# Altium footprint library micromouse_Lib.PcbLib: 7 footprints
Each footprint in its own frame and in the unit in brackets; x right, y up, seen from the top. Pads: shape width x height; smd on the part's side, far side on the other; paste and mask are expansions set on the pad; w line width, h text height; cw(c..) or ccw(c..) is an arc to the next point about the centre after c.
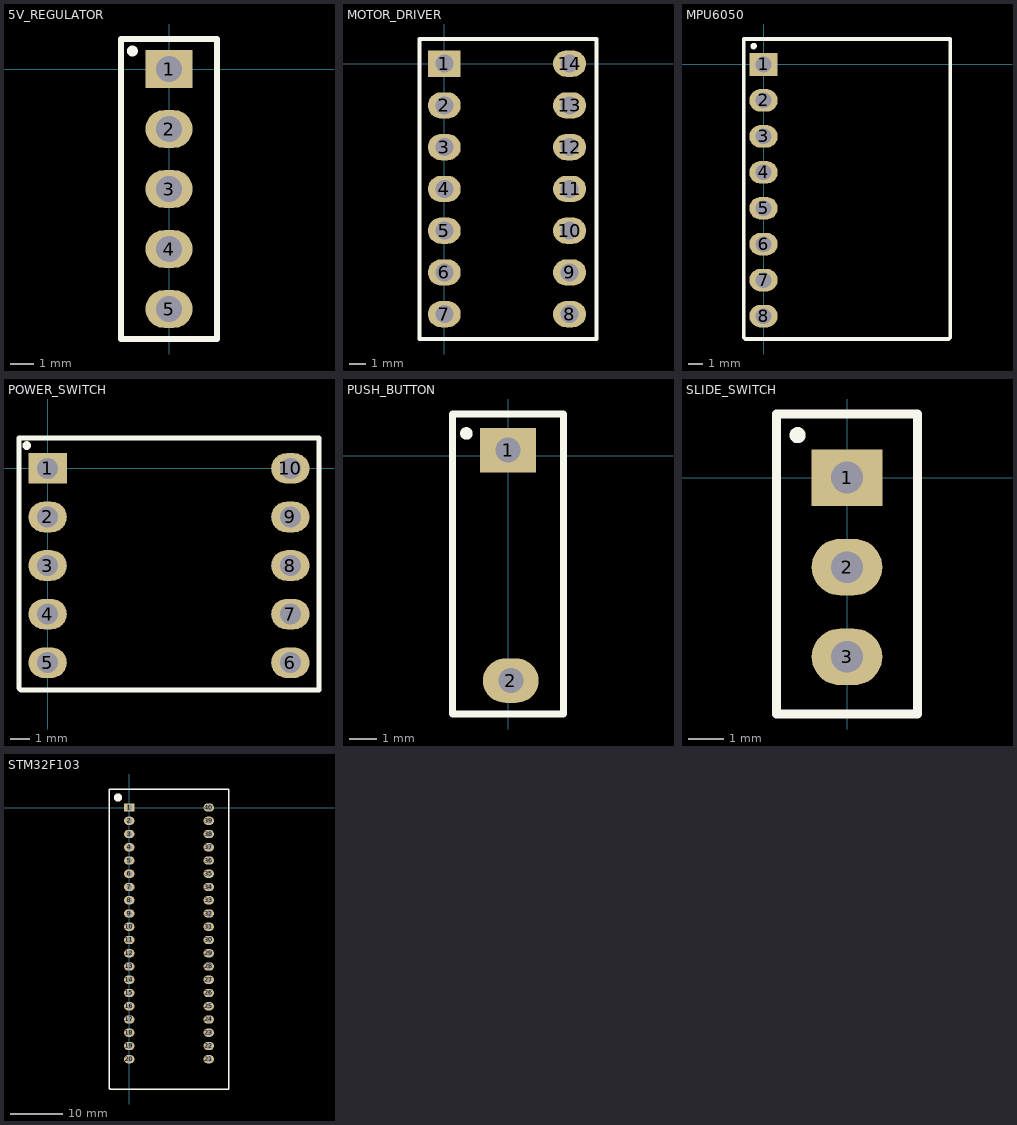
[diagram p0: the footprints below, top view; thin cyan lines are the x and y axes]

## 5V_REGULATOR [mm]
pads (5):
  rect 2x1.6 hole 1.1: 1(0,0)
  oval 2x1.6 hole 1.1: 2(0,-2.54) 3(0,-5.08) 4(0,-7.62) 5(0,-10.16)
Top Overlay:
  circle w0.254: c-1.549,0.762 r0.102
  lines w0.254: -2.032,-11.43 2.032,-11.43 2.032,1.27 -2.032,1.27 -2.032,-11.43
3D body "Step Down Buck.STEP": height 17.78, standoff 0, extent -2.038,-11.43 1.778,1.27

## MOTOR_DRIVER [mm]
pads (14):
  rect 2x1.6 hole 1.1: 1(0,0)
  oval 2x1.6 hole 1.1: 2(0,-2.54) 3(0,-5.08) 4(0,-7.62) 5(0,-10.16) 6(0,-12.7) 7(0,-15.24) 8(7.62,-15.24) 9(7.62,-12.7) 10(7.62,-10.16) 11(7.62,-7.62) 12(7.62,-5.08) 13(7.62,-2.54) 14(7.62,0)
Top Overlay:
  lines w0.254: -1.5,-16.75 9.25,-16.75 9.25,1.5 -1.5,1.5 -1.5,-16.75
3D body "Dual motor driver.STEP": height 11.82, standoff 9, extent -1.26,-16.49 8.9,1.29
3D body "User Library-zl262-7s_p2-54_l18-28_w2-54_h8-5.STEP": height 8.5, standoff -3, extent -1.24,-16.74 1.3,1.54
3D body "User Library-zl262-7s_p2-54_l18-28_w2-54_h8-5.STEP": height 8.5, standoff -3, extent 6.36,-16.74 8.9,1.54

## MPU6050 [mm]
pads (8):
  rect 2x1.6 hole 1.1: 1(0,0)
  oval 2x1.6 hole 1.1: 2(0,-2.54) 3(0,-5.08) 4(0,-7.62) 5(0,-10.16) 6(0,-12.7) 7(0,-15.24) 8(0,-17.78)
Top Overlay:
  circle w0.254: c-0.7,1.3 r0.1
  lines w0.254: -1.4,-19.3 -1.3,-19.4 13.1,-19.4 13.2,-19.3 13.2,0.5 13.2,1.8 -1.4,1.8 -1.4,-19.3
3D body "MPU 6050.STEP": height 8.94, standoff -2.23, extent -1.371,-19.368 14.503,1.74

## POWER_SWITCH [mm]
pads (10):
  rect 2x1.6 hole 1.1: 1(0,0)
  oval 2x1.6 hole 1.1: 2(0,-2.54) 3(0,-5.08) 4(0,-7.62) 5(0,-10.16) 6(12.7,-10.16) 7(12.7,-7.62) 8(12.7,-5.08) 9(12.7,-2.54) 10(12.7,0)
Top Overlay:
  circle w0.254: c-1.1,1.2 r0.1
  lines w0.254: -1.5,-11.5 -1.4,-11.6 14.2,-11.6 14.2,1.6 -1.5,1.6 -1.5,-11.5
3D body "Female Header 5 pin.STEP": height 8.5, standoff -3, extent 11.46,-11.6 14,1.6
3D body "Female Header 5 pin.STEP": height 8.5, standoff -3, extent -1.24,-11.6 1.3,1.6
3D body "Protection Switch.STEP": height 11.22, standoff 8.8, extent -1.32,-14.535 13.92,1.6

## PUSH_BUTTON [mm]
pads (2):
  rect 2x1.6 hole 0.9: 1(0,0.2)
  oval 2x1.6 hole 0.9: 2(0.1,-8.1)
Top Overlay:
  circle w0.254: c-1.5,0.8 r0.1
  lines w0.254: -2,-9.3 -2,1.5 2,1.5 2,-9.3 -2,-9.3
3D body "push button 2.STEP": height 4.3, standoff 0, extent -1.8,-8 1.7,0

## SLIDE_SWITCH [mm]
pads (3):
  rect 2x1.6 hole 0.9: 1(0,0)
  oval 2x1.6 hole 0.9: 2(0,-2.54) 3(0,-5.08)
Top Overlay:
  circle w0.254: c-1.4,1.2 r0.1
  lines w0.254: -2,-6.7 -2,1.8 2,1.8 2,-6.7 -2,-6.7
3D body "Slide switch.STEP": height 7, standoff -4.5, extent -1.9,-6.775 2,1.775

## STM32F103 [mm]
pads (40):
  rect 2x1.6 hole 1.1: 1(0,0)
  oval 2x1.6 hole 1.1: 2(0,-2.54) 3(0,-5.08) 4(0,-7.62) 5(0,-10.16) 6(0,-12.7) 7(0,-15.24) 8(0,-17.78) 9(0,-20.32) 10(0,-22.86) 11(0,-25.4) 12(0,-27.94) 13(0,-30.48) 14(0,-33.02) 15(0,-35.56) 16(0,-38.1) 17(0,-40.64) 18(0,-43.18) 19(0,-45.72) 20(0,-48.26) 21(15.24,-48.26) 22(15.24,-45.72) 23(15.24,-43.18) 24(15.24,-40.64) 25(15.24,-38.1) 26(15.24,-35.56) 27(15.24,-33.02) 28(15.24,-30.48) 29(15.24,-27.94) 30(15.24,-25.4) 31(15.24,-22.86) 32(15.24,-20.32) 33(15.24,-17.78) 34(15.24,-15.24) 35(15.24,-12.7) 36(15.24,-10.16) 37(15.24,-7.62) 38(15.24,-5.08) 39(15.24,-2.54) 40(15.24,0)
Top Overlay:
  circle w1: c-2.159,1.905 r0.284
  lines w0.254: -3.81,-53.848 -3.81,3.556 19.05,3.556 19.05,-53.975 -3.683,-53.975 -3.81,-53.848
3D body "STM.STEP": height 21.77, standoff 3.5, extent -3.86,-54.18 19,3.38
3D body "header female 10 pin.STEP": height 9, standoff -2.5, extent -1.34,-24.25 1.2,1.65
3D body "header female 10 pin.STEP": height 9, standoff -2.5, extent -1.34,-50.4 1.2,-24.5
3D body "header female 10 pin.STEP": height 9, standoff -2.5, extent 13.86,-24.4 16.4,1.5
3D body "header female 10 pin.STEP": height 9, standoff -2.5, extent 13.83,-50.15 16.37,-24.25